# Altium footprint library 13-IC Packages-2smt4e.PcbLib: 49 footprints (part 3 of 4)
Each footprint in its own frame and in the unit in brackets; x right, y up, seen from the top. Pads: shape width x height; smd on the part's side, far side on the other; paste and mask are expansions set on the pad; w line width, h text height; cw(c..) or ccw(c..) is an arc to the next point about the centre after c.
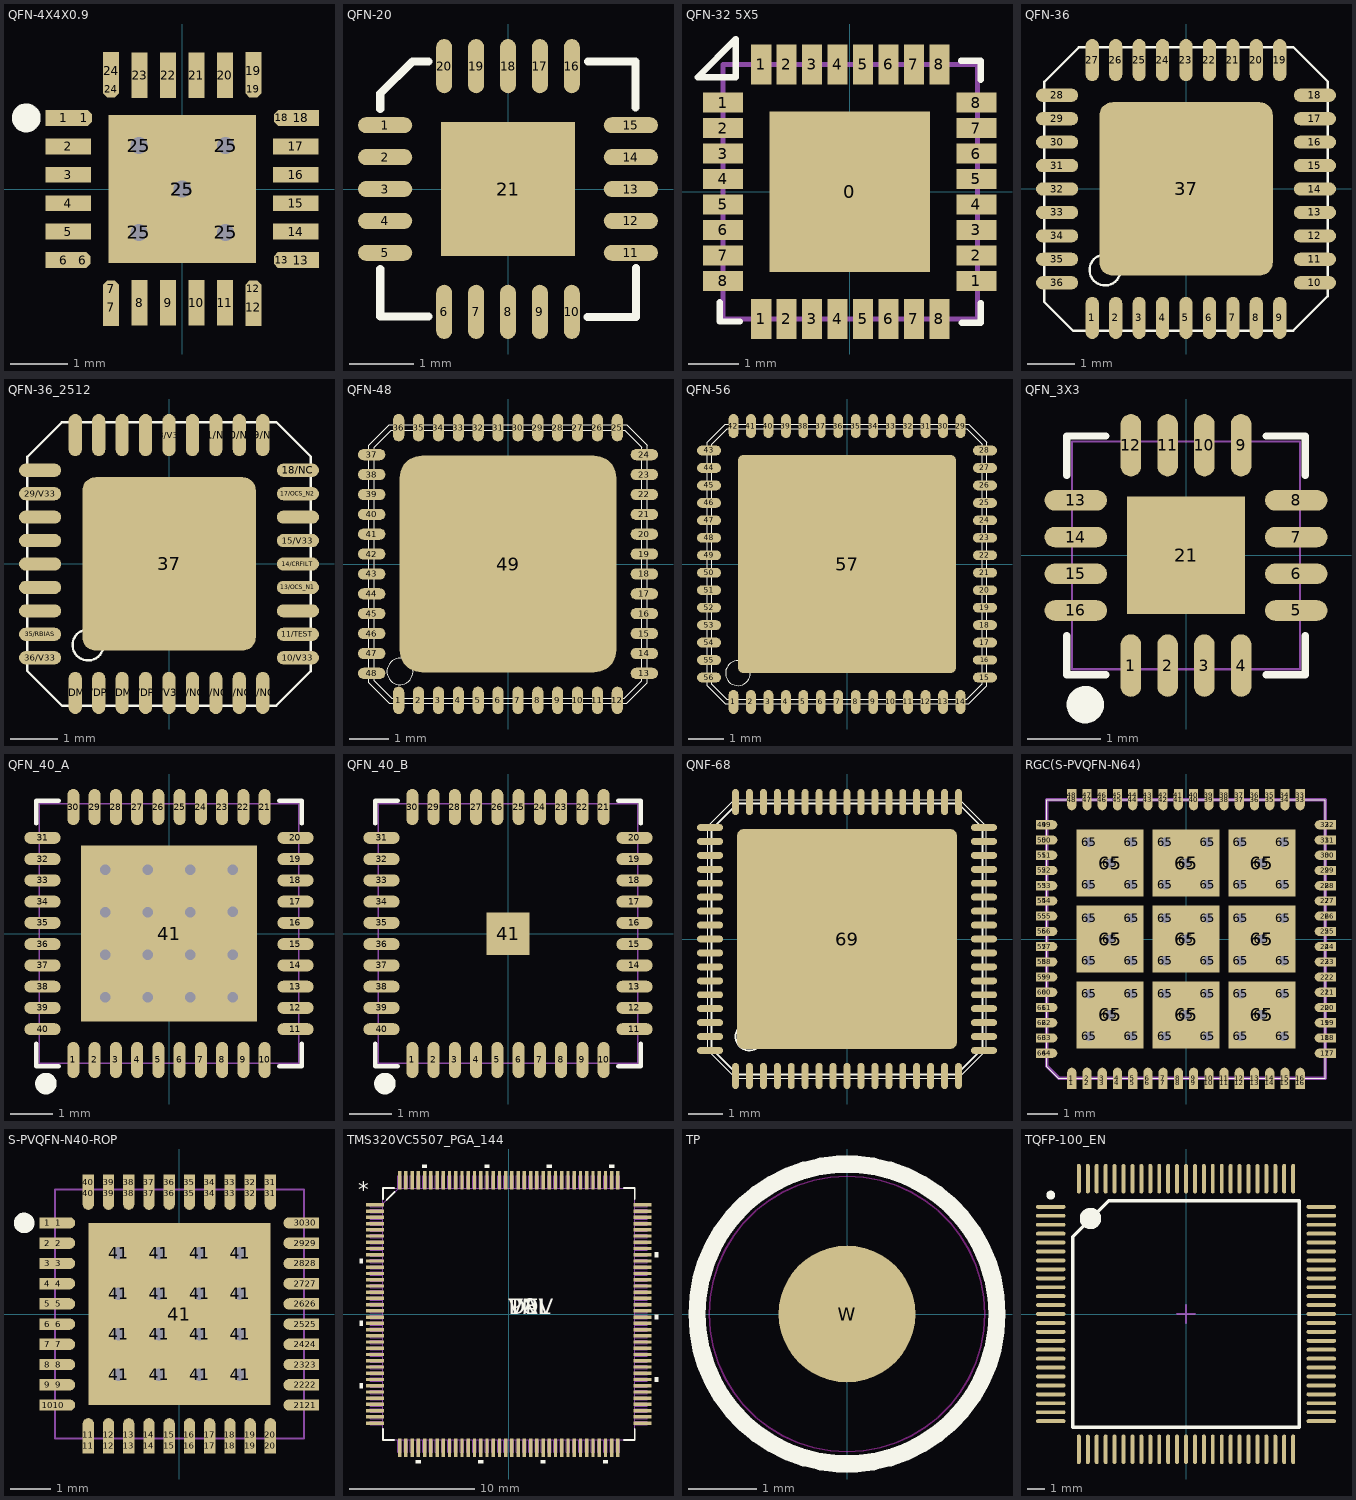
[diagram p2: the footprints below, top view; thin cyan lines are the x and y axes]

## QFN-4X4X0.9 [mm]
pads (38):
  rect 0.65x0.28 smd mask+0.05: 1(-2.08,1.25) 6(-2.08,-1.25) 13(2.08,-1.25) 18(2.08,1.25)
  oct 0.28x0.28 smd mask+0.05: 1(-1.727,1.25) 6(-1.753,-1.25) 7(-1.25,-1.753) 12(1.25,-1.753) 13(1.75,-1.25) 18(1.753,1.25) 19(1.25,1.753) 24(-1.25,1.753)
  rect 0.8x0.28 smd mask+0.05: 2(-2,0.75) 3(-2,0.25) 4(-2,-0.25) 5(-2,-0.75) 14(2,-0.75) 15(2,-0.25) 16(2,0.25) 17(2,0.75)
  rect 0.28x0.65 smd mask+0.05: 7(-1.25,-2.08) 12(1.25,-2.08) 19(1.25,2.08) 24(-1.25,2.08)
  rect 0.28x0.8 smd mask+0.05: 8(-0.75,-2) 9(-0.25,-2) 10(0.25,-2) 11(0.75,-2) 20(0.75,2) 21(0.25,2) 22(-0.25,2) 23(-0.75,2)
  round 0.6 hole 0.3: 25(-0.762,-0.762) 25(-0.762,0.762) 25(0,0) 25(0.762,-0.762) 25(0.762,0.762)
  rect 2.6x2.6 smd mask+0.05: 25(0,0)
Top Overlay:
  circle w0.254: c-2.743,1.25 r0.127
Top Solder:
  region: -2.057,1.651 -2.159,1.651 -2.159,2.159 -1.651,2.159 -1.651,2.057 -2.057,2.057
  region: -1.651,-2.057 -1.651,-2.159 -2.159,-2.159 -2.159,-1.651 -2.057,-1.651 -2.057,-2.057
  region: 2.057,-1.651 2.159,-1.651 2.159,-2.159 1.651,-2.159 1.651,-2.057 2.057,-2.057
  region: 1.651,2.057 1.651,2.159 2.159,2.159 2.159,1.651 2.057,1.651 2.057,2.057
3D body "qfn-4x4.stp": height 0.85, standoff 0, extent -2.01,-2.01 2.01,2.01

## QFN-20 [mm]
pads (21):
  oval 0.85x0.25 smd: 1(-1.925,1) 2(-1.925,0.5) 3(-1.925,0) 4(-1.925,-0.5) 5(-1.925,-1) 11(1.925,-1) 12(1.925,-0.5) 13(1.925,0) 14(1.925,0.5) 15(1.925,1)
  oval 0.25x0.85 smd: 6(-1,-1.925) 7(-0.5,-1.925) 8(0,-1.925) 9(0.5,-1.925) 10(1,-1.925) 16(1,1.925) 17(0.5,1.925) 18(0,1.925) 19(-0.5,1.925) 20(-1,1.925)
  rrect0% 2.1x2.1 smd: 21(0,0)
Top Overlay:
  lines w0.127: -2.001,-1.254 -2.001,-2 -1.245,-2 ; -2.001,1.253 -2.001,1.495 -1.499,1.997 -1.245,1.997 ; 1.243,-2.005 2.003,-2.005 2.003,-1.239 ; 1.252,1.996 1.999,1.996 1.999,1.274
3D body "qfn-4x4.stp": height 0.85, standoff 0, extent -2.01,-2.01 2.01,2.01

## QFN-32 5X5 [mm]
pads (33):
  rect 3.2x3.2 smd mask+0.051: 0(0,0)
  rect 0.8x0.4 smd: 1(-2.527,1.778) 1(2.527,-1.778) 2(-2.527,1.27) 2(2.527,-1.27) 3(-2.527,0.762) 3(2.527,-0.762) 4(-2.527,0.254) 4(2.527,-0.254) 5(-2.527,-0.254) 5(2.527,0.254) 6(-2.527,-0.762) 6(2.527,0.762) 7(-2.527,-1.27) 7(2.527,1.27) 8(-2.527,-1.778) 8(2.527,1.778)
  rect 0.4x0.8 smd: 1(-1.765,-2.54) 1(-1.765,2.54) 2(-1.257,-2.54) 2(-1.257,2.54) 3(-0.749,-2.54) 3(-0.749,2.54) 4(-0.241,-2.54) 4(-0.241,2.54) 5(0.267,-2.54) 5(0.267,2.54) 6(0.775,-2.54) 6(0.775,2.54) 7(1.283,-2.54) 7(1.283,2.54) 8(1.791,-2.54) 8(1.791,2.54)
Top Overlay:
  lines w0.127: -2.591,-2.21 -2.591,-2.591 -2.197,-2.591 ; 2.222,2.616 2.616,2.616 2.616,2.235 ; 2.235,-2.616 2.616,-2.616 2.616,-2.222 ; -3.035,2.286 -2.273,2.286 -2.273,2.921 -2.273,3.048 -3.035,2.286
Mechanical 15:
  lines w0.1: -2.527,-2.54 -2.527,2.54 2.553,2.54 2.553,-2.54 -2.527,-2.54
3D body "qfn32pad.stp": height 0, standoff 0, extent -2.94,1.578 -2.14,1.978
3D body "qfn32pad.stp": height 0, standoff 0, extent -2.94,1.07 -2.14,1.47
3D body "qfn32pad.stp": height 0, standoff 0, extent -2.94,0.562 -2.14,0.962
3D body "qfn32pad.stp": height 0, standoff 0, extent -2.94,0.054 -2.14,0.454
3D body "qfn32pad.stp": height 0, standoff 0, extent -2.94,-0.454 -2.14,-0.054
3D body "qfn32pad.stp": height 0, standoff 0, extent -2.94,-0.962 -2.14,-0.562
3D body "qfn32pad.stp": height 0, standoff 0, extent -2.94,-1.47 -2.14,-1.07
3D body "qfn32pad.stp": height 0, standoff 0, extent -2.94,-1.978 -2.14,-1.578
3D body "qfn32pad.stp": height 0, standoff 0, extent -1.978,-2.94 -1.578,-2.14
3D body "qfn32pad.stp": height 0, standoff 0, extent -1.445,-2.94 -1.045,-2.14
3D body "qfn32pad.stp": height 0, standoff 0, extent -0.937,-2.94 -0.537,-2.14
3D body "qfn32pad.stp": height 0, standoff 0, extent -0.454,-2.94 -0.054,-2.14
3D body "qfn32pad.stp": height 0, standoff 0, extent 0.054,-2.94 0.454,-2.14
3D body "qfn32pad.stp": height 0, standoff 0, extent 0.562,-2.94 0.962,-2.14
3D body "qfn32pad.stp": height 0, standoff 0, extent 1.07,-2.94 1.47,-2.14
3D body "qfn32pad.stp": height 0, standoff 0, extent 1.603,-2.94 2.003,-2.14
3D body "qfn32pad.stp": height 0, standoff 0, extent 2.115,-1.978 2.915,-1.578
3D body "qfn32pad.stp": height 0, standoff 0, extent 2.115,-1.47 2.915,-1.07
3D body "qfn32pad.stp": height 0, standoff 0, extent 2.115,-0.962 2.915,-0.562
3D body "qfn32pad.stp": height 0, standoff 0, extent 2.115,-0.454 2.915,-0.054
3D body "qfn32pad.stp": height 0, standoff 0, extent 2.115,0.054 2.915,0.454
3D body "qfn32pad.stp": height 0, standoff 0, extent 2.115,0.562 2.915,0.962
3D body "qfn32pad.stp": height 0, standoff 0, extent 2.14,1.07 2.94,1.47
3D body "qfn32pad.stp": height 0, standoff 0, extent 2.115,1.578 2.915,1.978
3D body "qfn32pad.stp": height 0, standoff 0, extent 1.578,2.14 1.978,2.94
3D body "qfn32pad.stp": height 0, standoff 0, extent 1.096,2.14 1.496,2.94
3D body "qfn32pad.stp": height 0, standoff 0, extent 0.562,2.14 0.962,2.94
3D body "qfn32pad.stp": height 0, standoff 0, extent 0.054,2.14 0.454,2.94
3D body "qfn32pad.stp": height 0, standoff 0, extent -0.428,2.14 -0.028,2.94
3D body "qfn32pad.stp": height 0, standoff 0, extent -0.936,2.14 -0.536,2.94
3D body "qfn32pad.stp": height 0, standoff 0, extent -1.444,2.14 -1.044,2.94
3D body "qfn32pad.stp": height 0, standoff 0, extent -1.978,2.14 -1.578,2.94
3D body "qfn32-5x5.stp": height 1, standoff 0, extent -2.535,-2.538 2.535,2.538

## QFN-36 [mm]
pads (37):
  oval 0.28x0.9 smd mask+0.051: 1(-2.002,-2.752) 2(-1.502,-2.752) 3(-1.002,-2.752) 4(-0.502,-2.752) 5(-0.002,-2.752) 6(0.498,-2.752) 7(0.998,-2.752) 8(1.498,-2.752) 9(1.998,-2.752) 19(1.998,2.748) 20(1.498,2.748) 21(0.998,2.748) 22(0.498,2.748) 23(-0.002,2.748) 24(-0.502,2.748) 25(-1.002,2.748) 26(-1.502,2.748) 27(-2.002,2.748)
  oval 0.9x0.28 smd mask+0.051: 10(2.748,-2.002) 11(2.748,-1.502) 12(2.748,-1.002) 13(2.748,-0.502) 14(2.748,-0.002) 15(2.748,0.498) 16(2.748,0.998) 17(2.748,1.498) 18(2.748,1.998) 28(-2.752,1.998) 29(-2.752,1.498) 30(-2.752,0.998) 31(-2.752,0.498) 32(-2.752,-0.002) 33(-2.752,-0.502) 34(-2.752,-1.002) 35(-2.752,-1.502) 36(-2.752,-2.002)
  rrect15% 3.7x3.7 smd mask+0.051: 37(0,0)
Top Overlay:
  circle w0.051: c-1.73,-1.73 r0.33
  lines w0.051: -3.025,-2.411 -2.411,-3.025 2.284,-3.025 3.02,-2.288 3.02,2.288 2.288,3.02 -2.288,3.02 -3.025,2.284 -3.025,-2.411
3D body "qfn36.stp": height 0.8, standoff -0.01, extent -2.921,-2.946 2.949,2.924

## QFN-36_2512 [mm]
pads (37):
  oval 0.28x0.9 smd mask+0.051: 1/DM1(-2.002,-2.752) 2/DP1(-1.502,-2.752) 3/DM2(-1.002,-2.752) 4/DP2(-0.502,-2.752) 5/V33(-0.002,-2.752) 6/NC(0.498,-2.752) 7/NC(0.998,-2.752) 8/NC(1.498,-2.752) 9/NC(1.998,-2.752) 19/NC(1.998,2.748) 20/NC(1.498,2.748) 21/NC(0.998,2.748) 22/SDA/SMBDATA/NON_R(0.498,2.748) 23/V33(-0.002,2.748) 24/SCL/SMBCLK/CFG_SE(-0.502,2.748) 25/HS_IND/CFG_SEL1(-1.002,2.748) 26/RESET_N(-1.502,2.748) 27/VBUS_DET(-2.002,2.748)
  oval 0.9x0.28 smd mask+0.051: 10/V33(2.748,-2.002) 11/TEST(2.748,-1.502) 12/PRTPWR1/BC_EN1(2.748,-1.002) 13/OCS_N1(2.748,-0.502) 14/CRFILT(2.748,-0.002) 15/V33(2.748,0.498) 16/PRTPWR2/BC_EN2(2.748,0.998) 17/OCS_N2(2.748,1.498) 18/NC(2.748,1.998) 28/SUSP_IND/LOCAL_PW(-2.752,1.998) 29/V33(-2.752,1.498) 30/USBDM_UP(-2.752,0.998) 31/USBDP_UP(-2.752,0.498) 32/XTALOUT(-2.752,-0.002) 33/XTALIN/CLKIN(-2.752,-0.502) 34/PLLFILT(-2.752,-1.002) 35/RBIAS(-2.752,-1.502) 36/V33(-2.752,-2.002)
  rrect15% 3.7x3.7 smd mask+0.051: 37(0,0)
Top Overlay:
  circle w0.051: c-1.73,-1.73 r0.33
  lines w0.051: -3.025,-2.284 -3.025,2.284 -2.288,3.02 2.288,3.02 3.02,2.288 3.02,-2.288 2.284,-3.025 -2.284,-3.025 -3.025,-2.284
3D body "qfn36.stp": height 0.8, standoff -0.01, extent -2.924,-2.935 2.946,2.935

## QFN-48 [mm] "RFR6275"
pads (49):
  oval 0.28x0.69 smd mask+0.051: 1(-2.75,-3.429) 2(-2.25,-3.429) 3(-1.75,-3.429) 4(-1.25,-3.429) 5(-0.75,-3.429) 6(-0.25,-3.429) 7(0.25,-3.429) 8(0.75,-3.429) 9(1.25,-3.429) 10(1.75,-3.429) 11(2.25,-3.429) 12(2.75,-3.429) 25(2.75,3.429) 26(2.25,3.429) 27(1.75,3.429) 28(1.25,3.429) 29(0.75,3.429) 30(0.25,3.429) 31(-0.25,3.429) 32(-0.75,3.429) 33(-1.25,3.429) 34(-1.75,3.429) 35(-2.25,3.429) 36(-2.75,3.429)
  oval 0.69x0.28 smd mask+0.051: 13(3.429,-2.75) 14(3.429,-2.25) 15(3.429,-1.75) 16(3.429,-1.25) 17(3.429,-0.75) 18(3.429,-0.25) 19(3.429,0.25) 20(3.429,0.75) 21(3.429,1.25) 22(3.429,1.75) 23(3.429,2.25) 24(3.429,2.75) 37(-3.429,2.75) 38(-3.429,2.25) 39(-3.429,1.75) 40(-3.429,1.25) 41(-3.429,0.75) 42(-3.429,0.25) 43(-3.429,-0.25) 44(-3.429,-0.75) 45(-3.429,-1.25) 46(-3.429,-1.75) 47(-3.429,-2.25) 48(-3.429,-2.75)
  rrect20% 5.45x5.45 smd mask+0.051: 49(0,0)
Top Overlay:
  circle w0.025: c-2.718,-2.705 r0.33
  lines w0.005: -3.5,-2.983 -3.5,2.984 -2.984,3.5 2.984,3.5 3.5,2.984 3.5,-2.984 2.984,-3.5 -2.983,-3.5 -3.5,-2.983
  lines w0.025: -3.365,-2.934 -2.921,-3.378 2.921,-3.378 3.365,-2.934 3.365,2.934 2.934,3.365 -2.934,3.365 -3.365,2.934 -3.365,-2.934
3D body "qfn_48.stp": height 0.85, standoff 0, extent -3.505,-3.531 3.525,3.499

## QFN-56 [mm] "RTR6275"
pads (57):
  oval 0.28x0.69 smd mask+0.051: 1(-3.25,-3.95) 2(-2.75,-3.95) 3(-2.25,-3.95) 4(-1.75,-3.95) 5(-1.25,-3.95) 6(-0.75,-3.95) 7(-0.25,-3.95) 8(0.25,-3.95) 9(0.75,-3.95) 10(1.25,-3.95) 11(1.75,-3.95) 12(2.25,-3.95) 13(2.75,-3.95) 14(3.25,-3.95) 29(3.25,3.95) 30(2.75,3.95) 31(2.25,3.95) 32(1.75,3.95) 33(1.25,3.95) 34(0.75,3.95) 35(0.25,3.95) 36(-0.25,3.95) 37(-0.75,3.95) 38(-1.25,3.95) 39(-1.75,3.95) 40(-2.25,3.95) 41(-2.75,3.95) 42(-3.25,3.95)
  oval 0.69x0.28 smd mask+0.051: 15(3.95,-3.25) 17(3.95,-2.25) 18(3.95,-1.75) 19(3.95,-1.25) 20(3.95,-0.75) 21(3.95,-0.25) 22(3.95,0.25) 23(3.95,0.75) 24(3.95,1.25) 25(3.95,1.75) 26(3.95,2.25) 27(3.95,2.75) 28(3.95,3.25) 43(-3.95,3.25) 44(-3.95,2.75) 45(-3.95,2.25) 46(-3.95,1.75) 47(-3.95,1.25) 48(-3.95,0.75) 49(-3.95,0.25) 50(-3.95,-0.25) 51(-3.95,-0.75) 52(-3.95,-1.25) 53(-3.95,-1.75) 54(-3.95,-2.25) 55(-3.95,-2.75) 56(-3.95,-3.25)
  oval 0.69x0.25 smd mask+0.051: 16(3.95,-2.75)
  rrect5% 6.25x6.25 smd mask+0.051: 57(0,0)
Top Overlay:
  circle w0.025: c-3.124,-3.124 r0.356
  lines w0.005: -4,-3.486 -3.486,-4 3.486,-4 4,-3.486 4,3.485 3.485,4 -3.485,4 -4,3.485 -4,-3.486
  lines w0.025: -3.873,-3.442 -3.442,-3.873 3.429,-3.873 3.873,-3.429 3.873,3.429 3.429,3.873 -3.429,3.873 -3.873,3.429 -3.873,-3.442
3D body "qfn_56.stp": height 0.85, standoff 0, extent -4.039,-4.013 3.963,3.988

## QFN_3X3 [mm]
pads (17):
  oval 0.28x0.85 smd mask+0.07: 1(-0.75,-1.5) 2(-0.25,-1.5) 3(0.25,-1.5) 4(0.75,-1.5) 9(0.75,1.5) 10(0.25,1.5) 11(-0.25,1.5) 12(-0.75,1.5)
  oval 0.85x0.28 smd mask+0.07: 5(1.5,-0.75) 6(1.5,-0.25) 7(1.5,0.25) 8(1.5,0.75) 13(-1.5,0.75) 14(-1.5,0.25) 15(-1.5,-0.25) 16(-1.5,-0.75)
  rect 1.6x1.6 smd mask+0.07: 21(0,0)
Top Overlay:
  circle w0.254: c-1.372,-2.032 r0.127
  lines w0.1: -1.626,-1.092 -1.626,-1.626 -1.092,-1.626 ; -1.626,1.092 -1.626,1.626 -1.092,1.626 ; 1.092,-1.626 1.626,-1.626 1.626,-1.092 ; 1.092,1.626 1.626,1.626 1.626,1.092
Mechanical 15:
  lines w0.03: -1.55,-1.55 -1.55,1.55 1.55,1.55 1.55,-1.55 -1.55,-1.55
3D body "qfn3x3.stp": height 1, standoff 0, extent -1.56,-1.56 1.56,1.56
3D body "0_28-0_95.stp": height 0.01, standoff 0, extent -1.975,0.61 -1.025,0.89
3D body "0_28-0_95.stp": height 0.01, standoff 0, extent -1.975,0.11 -1.025,0.39
3D body "0_28-0_95.stp": height 0.01, standoff 0, extent -1.975,-0.39 -1.025,-0.11
3D body "0_28-0_95.stp": height 0.01, standoff 0, extent -1.975,-0.89 -1.025,-0.61
3D body "0_28-0_95.stp": height 0.01, standoff 0, extent -0.89,-1.975 -0.61,-1.025
3D body "0_28-0_95.stp": height 0.01, standoff 0, extent -0.39,-1.975 -0.11,-1.025
3D body "0_28-0_95.stp": height 0.01, standoff 0, extent 0.11,-1.975 0.39,-1.025
3D body "0_28-0_95.stp": height 0.01, standoff 0, extent 0.61,-1.975 0.89,-1.025
3D body "0_28-0_95.stp": height 0.01, standoff 0, extent 1.025,-0.89 1.975,-0.61
3D body "0_28-0_95.stp": height 0.01, standoff 0, extent 1.025,-0.39 1.975,-0.11
3D body "0_28-0_95.stp": height 0.01, standoff 0, extent 1.025,0.11 1.975,0.39
3D body "0_28-0_95.stp": height 0.01, standoff 0, extent 1.025,0.61 1.975,0.89
3D body "0_28-0_95.stp": height 0.01, standoff 0, extent 0.61,1.025 0.89,1.975
3D body "0_28-0_95.stp": height 0.01, standoff 0, extent 0.11,1.025 0.39,1.975
3D body "0_28-0_95.stp": height 0.01, standoff 0, extent -0.39,1.025 -0.11,1.975
3D body "0_28-0_95.stp": height 0.01, standoff 0, extent -0.89,1.025 -0.61,1.975

## QFN_40_A [mm] "QFN_40"
pads (57):
  oval 0.28x0.85 smd mask+0.07: 1(-2.25,-2.975) 2(-1.75,-2.975) 3(-1.25,-2.975) 4(-0.75,-2.975) 5(-0.25,-2.975) 6(0.25,-2.975) 7(0.75,-2.975) 8(1.25,-2.975) 9(1.75,-2.975) 10(2.25,-2.975) 21(2.25,2.975) 22(1.75,2.975) 23(1.25,2.975) 24(0.75,2.975) 25(0.25,2.975) 26(-0.25,2.975) 27(-0.75,2.975) 28(-1.25,2.975) 29(-1.75,2.975) 30(-2.25,2.975)
  oval 0.85x0.28 smd mask+0.07: 11(2.975,-2.25) 12(2.975,-1.75) 13(2.975,-1.25) 14(2.975,-0.75) 15(2.975,-0.25) 16(2.975,0.25) 17(2.975,0.75) 18(2.975,1.25) 19(2.975,1.75) 20(2.975,2.25) 31(-2.975,2.25) 32(-2.975,1.75) 33(-2.975,1.25) 34(-2.975,0.75) 35(-2.975,0.25) 36(-2.975,-0.25) 37(-2.975,-0.75) 38(-2.975,-1.25) 39(-2.975,-1.75) 40(-2.975,-2.25)
  rect 4.15x4.15 smd: 41(0,0)
  round 0.5 hole 0.25 mask+0.07: ""(-1.5,-1.5) ""(-1.5,-0.5) ""(-1.5,0.5) ""(-1.5,1.5) ""(-0.5,-1.5) ""(-0.5,-0.5) ""(-0.5,0.5) ""(-0.5,1.5) ""(0.5,-1.5) ""(0.5,-0.5) ""(0.5,0.5) ""(0.5,1.5) ""(1.5,-1.5) ""(1.5,-0.5) ""(1.5,0.508) ""(1.5,1.5)
Top Overlay:
  circle w0.254: c-2.896,-3.531 r0.127
  lines w0.1: -3.124,-2.591 -3.124,-3.124 -2.591,-3.124 ; -3.124,2.591 -3.124,3.124 -2.591,3.124 ; 2.591,-3.124 3.124,-3.124 3.124,-2.591 ; 2.591,3.124 3.124,3.124 3.124,2.591
Mechanical 15:
  lines w0.03: -3.05,-3.05 -3.05,3.05 3.05,3.05 3.05,-3.05 -3.05,-3.05
3D body "hmc833.stp": height 0.9, standoff 0, extent -3.06,-3.06 3.06,3.06

## QFN_40_B [mm]
pads (41):
  oval 0.28x0.85 smd mask+0.07: 1(-2.25,-2.975) 2(-1.75,-2.975) 3(-1.25,-2.975) 4(-0.75,-2.975) 5(-0.25,-2.975) 6(0.25,-2.975) 7(0.75,-2.975) 8(1.25,-2.975) 9(1.75,-2.975) 10(2.25,-2.975) 21(2.25,2.975) 22(1.75,2.975) 23(1.25,2.975) 24(0.75,2.975) 25(0.25,2.975) 26(-0.25,2.975) 27(-0.75,2.975) 28(-1.25,2.975) 29(-1.75,2.975) 30(-2.25,2.975)
  oval 0.85x0.28 smd mask+0.07: 11(2.975,-2.25) 12(2.975,-1.75) 13(2.975,-1.25) 14(2.975,-0.75) 15(2.975,-0.25) 16(2.975,0.25) 17(2.975,0.75) 18(2.975,1.25) 19(2.975,1.75) 20(2.975,2.25) 31(-2.975,2.25) 32(-2.975,1.75) 33(-2.975,1.25) 34(-2.975,0.75) 35(-2.975,0.25) 36(-2.975,-0.25) 37(-2.975,-0.75) 38(-2.975,-1.25) 39(-2.975,-1.75) 40(-2.975,-2.25)
  rect 1x1 smd: 41(0,0)
Top Overlay:
  circle w0.254: c-2.896,-3.531 r0.127
  lines w0.1: -3.124,-2.591 -3.124,-3.124 -2.591,-3.124 ; -3.124,2.591 -3.124,3.124 -2.591,3.124 ; 2.591,-3.124 3.124,-3.124 3.124,-2.591 ; 2.591,3.124 3.124,3.124 3.124,2.591
Mechanical 15:
  lines w0.03: -3.05,-3.05 3.05,-3.05 3.05,3.05 -3.05,3.05 -3.05,-3.05
3D body "hmc833.stp": height 0.9, standoff 0, extent -3.06,-3.06 3.06,3.06
3D body "0_28-0_95.stp": height 0.01, standoff 0, extent 2.446,-2.4 3.396,-2.121
3D body "0_28-0_95.stp": height 0.01, standoff 0, extent 2.446,-1.892 3.396,-1.613
3D body "0_28-0_95.stp": height 0.01, standoff 0, extent 2.446,-1.384 3.396,-1.105
3D body "0_28-0_95.stp": height 0.01, standoff 0, extent 2.446,-0.876 3.396,-0.597
3D body "0_28-0_95.stp": height 0.01, standoff 0, extent 2.446,-0.368 3.396,-0.089
3D body "0_28-0_95.stp": height 0.01, standoff 0, extent 2.446,0.114 3.396,0.394
3D body "0_28-0_95.stp": height 0.01, standoff 0, extent 2.446,0.622 3.396,0.902
3D body "0_28-0_95.stp": height 0.01, standoff 0, extent 2.446,1.13 3.396,1.41
3D body "0_28-0_95.stp": height 0.01, standoff 0, extent 2.446,1.613 3.396,1.893
3D body "0_28-0_95.stp": height 0.01, standoff 0, extent 2.446,2.121 3.396,2.401
3D body "0_28-0_95.stp": height 0.01, standoff 0, extent -3.396,2.121 -2.446,2.401
3D body "0_28-0_95.stp": height 0.01, standoff 0, extent -3.396,1.613 -2.446,1.893
3D body "0_28-0_95.stp": height 0.01, standoff 0, extent -3.396,1.105 -2.446,1.385
3D body "0_28-0_95.stp": height 0.01, standoff 0, extent -3.396,0.622 -2.446,0.902
3D body "0_28-0_95.stp": height 0.01, standoff 0, extent -3.396,0.114 -2.446,0.394
3D body "0_28-0_95.stp": height 0.01, standoff 0, extent -3.396,-0.394 -2.446,-0.114
3D body "0_28-0_95.stp": height 0.01, standoff 0, extent -3.396,-0.902 -2.446,-0.622
3D body "0_28-0_95.stp": height 0.01, standoff 0, extent -3.396,-1.384 -2.446,-1.105
3D body "0_28-0_95.stp": height 0.01, standoff 0, extent -3.396,-1.892 -2.446,-1.613
3D body "0_28-0_95.stp": height 0.01, standoff 0, extent -3.396,-2.375 -2.446,-2.095
3D body "0_28-0_95.stp": height 0.01, standoff 0, extent -2.375,-3.396 -2.095,-2.446
3D body "0_28-0_95.stp": height 0.01, standoff 0, extent -1.893,-3.396 -1.613,-2.446
3D body "0_28-0_95.stp": height 0.01, standoff 0, extent -1.385,-3.396 -1.105,-2.446
3D body "0_28-0_95.stp": height 0.01, standoff 0, extent -0.902,-3.396 -0.622,-2.446
3D body "0_28-0_95.stp": height 0.01, standoff 0, extent -0.394,-3.396 -0.114,-2.446
3D body "0_28-0_95.stp": height 0.01, standoff 0, extent 0.114,-3.396 0.394,-2.446
3D body "0_28-0_95.stp": height 0.01, standoff 0, extent 0.622,-3.396 0.902,-2.446
3D body "0_28-0_95.stp": height 0.01, standoff 0, extent 1.105,-3.396 1.384,-2.446
3D body "0_28-0_95.stp": height 0.01, standoff 0, extent 1.613,-3.396 1.892,-2.446
3D body "0_28-0_95.stp": height 0.01, standoff 0, extent 2.095,-3.396 2.375,-2.446
3D body "0_28-0_95.stp": height 0.01, standoff 0, extent 2.121,2.446 2.401,3.396
3D body "0_28-0_95.stp": height 0.01, standoff 0, extent 1.613,2.446 1.893,3.396
3D body "0_28-0_95.stp": height 0.01, standoff 0, extent 1.105,2.446 1.385,3.396
3D body "0_28-0_95.stp": height 0.01, standoff 0, extent 0.622,2.446 0.902,3.396
3D body "0_28-0_95.stp": height 0.01, standoff 0, extent 0.114,2.446 0.394,3.396
3D body "0_28-0_95.stp": height 0.01, standoff 0, extent -0.394,2.446 -0.114,3.396
3D body "0_28-0_95.stp": height 0.01, standoff 0, extent -0.876,2.471 -0.597,3.421
3D body "0_28-0_95.stp": height 0.01, standoff 0, extent -1.41,2.446 -1.13,3.396
3D body "0_28-0_95.stp": height 0.01, standoff 0, extent -1.892,2.446 -1.613,3.396
3D body "0_28-0_95.stp": height 0.01, standoff 0, extent -2.375,2.446 -2.095,3.396

## QNF-68 [mm] "RTR6280 / RTR6285"
pads (69):
  oval 0.2x0.75 smd paste+0 mask+0.051: 1(-3.2,-3.93) 2(-2.8,-3.93) 3(-2.4,-3.93) 4(-2,-3.93) 5(-1.6,-3.93) 6(-1.2,-3.93) 7(-0.8,-3.93) 8(-0.4,-3.93) 9(0,-3.93) 10(0.4,-3.93) 11(0.8,-3.93) 12(1.2,-3.93) 13(1.6,-3.93) 14(2,-3.93) 15(2.4,-3.93) 16(2.8,-3.93) 17(3.2,-3.93) 35(3.2,3.93) 36(2.8,3.93) 37(2.4,3.93) 38(2,3.93) 39(1.6,3.93) 40(1.2,3.93) 41(0.8,3.93) 42/GPS_IN(0.4,3.93) 43(0,3.93) 44(-0.4,3.93) 45(-0.8,3.93) 46(-1.2,3.93) 47(-1.6,3.93) 48(-2,3.93) 49(-2.4,3.93) 50(-2.8,3.93) 51(-3.2,3.93)
  oval 0.75x0.2 smd paste+0 mask+0.051: 18(3.93,-3.2) 19/NC(3.93,-2.8) 20(3.93,-2.4) 21(3.93,-2) 22(3.93,-1.6) 23(3.93,-1.2) 24(3.93,-0.8) 25(3.93,-0.4) 26(3.93,0) 27(3.93,0.4) 28(3.93,0.8) 29(3.93,1.2) 30(3.93,1.6) 31(3.93,2) 32(3.93,2.4) 33(3.93,2.8) 34(3.93,3.2) 52(-3.93,3.2) 53(-3.93,2.8) 54(-3.93,2.4) 55(-3.93,2) 56(-3.93,1.6) 57(-3.93,1.2) 58(-3.93,0.8) 59(-3.93,0.4) 60(-3.93,0) 61(-3.93,-0.4) 62(-3.93,-0.8) 63(-3.93,-1.2) 64(-3.93,-1.6) 65(-3.93,-2) 66(-3.93,-2.4) 67(-3.93,-2.8) 68(-3.93,-3.2)
  rrect5% 6.3x6.3 smd mask+0.051: 69(0,0)
Top Overlay:
  circle w0.051: c-2.8,-2.8 r0.4
  lines w0.013: -4,-3.2 -4,3.239 -3.239,4 3.239,4 4,3.239 4,-3.2 3.2,-4 -3.2,-4 -4,-3.2
  lines w0.051: -3.886,-3.15 -3.886,3.15 -3.15,3.886 3.2,3.886 3.886,3.2 3.886,-3.15 3.15,-3.886 -3.15,-3.886 -3.886,-3.15
3D body "qfn_68.stp": height 0.85, standoff 0, extent -4.017,-4.015 4.013,4.015

## RGC(S-PVQFN-N64) [mm]
pads (182):
  rect 0.3x0.4 smd mask+0.07: 1(-3.75,-4.724) 2(-3.25,-4.724) 3(-2.75,-4.724) 4(-2.25,-4.724) 5(-1.75,-4.724) 6(-1.25,-4.724) 7(-0.75,-4.724) 8(-0.25,-4.724) 9(0.25,-4.724) 10(0.75,-4.724) 11(1.25,-4.724) 12(1.75,-4.724) 13(2.25,-4.724) 14(2.75,-4.724) 15(3.25,-4.724) 16(3.75,-4.724) 33(3.75,4.724) 34(3.25,4.724) 35(2.75,4.724) 36(2.25,4.724) 37(1.75,4.724) 38(1.25,4.724) 39(0.75,4.724) 40(0.25,4.724) 41(-0.25,4.724) 42(-0.75,4.724) 43(-1.25,4.724) 44(-1.75,4.724) 45(-2.25,4.724) 46(-2.75,4.724) 47(-3.25,4.724) 48(-3.75,4.724)
  oval 0.3x0.7 smd mask+0.07: 1(-3.75,-4.575) 2(-3.25,-4.575) 3(-2.75,-4.575) 4(-2.25,-4.575) 5(-1.75,-4.575) 6(-1.25,-4.575) 7(-0.75,-4.575) 8(-0.25,-4.575) 9(0.25,-4.575) 10(0.75,-4.575) 11(1.25,-4.575) 12(1.75,-4.575) 13(2.25,-4.575) 14(2.75,-4.575) 15(3.25,-4.575) 16(3.75,-4.575) 33(3.75,4.575) 34(3.25,4.575) 35(2.75,4.575) 36(2.25,4.575) 37(1.75,4.575) 38(1.25,4.575) 39(0.75,4.575) 40(0.25,4.575) 41(-0.254,4.575) 42(-0.75,4.575) 43(-1.25,4.575) 44(-1.75,4.575) 45(-2.25,4.575) 46(-2.75,4.575) 47(-3.25,4.575) 48(-3.75,4.575)
  oval 0.7x0.3 smd mask+0.07: 17(4.575,-3.75) 18(4.575,-3.25) 19(4.575,-2.75) 20(4.575,-2.25) 21(4.575,-1.75) 22(4.575,-1.25) 23(4.575,-0.75) 24(4.575,-0.25) 25(4.575,0.25) 26(4.575,0.75) 27(4.575,1.25) 28(4.575,1.75) 29(4.575,2.25) 30(4.575,2.75) 31(4.575,3.25) 32(4.575,3.75) 49(-4.575,3.75) 50(-4.575,3.25) 51(-4.575,2.75) 52(-4.575,2.25) 53(-4.575,1.75) 54(-4.575,1.25) 55(-4.575,0.75) 56(-4.575,0.25) 57(-4.575,-0.25) 58(-4.575,-0.75) 59(-4.575,-1.25) 60(-4.575,-1.75) 61(-4.575,-2.25) 62(-4.575,-2.75) 63(-4.575,-3.25) 64(-4.575,-3.75)
  rect 0.4x0.3 smd mask+0.07: 17(4.724,-3.75) 18(4.724,-3.25) 19(4.724,-2.75) 20(4.724,-2.25) 21(4.724,-1.75) 22(4.724,-1.25) 23(4.724,-0.75) 24(4.724,-0.25) 25(4.724,0.25) 26(4.724,0.75) 27(4.724,1.25) 28(4.724,1.75) 29(4.724,2.25) 30(4.724,2.75) 31(4.724,3.25) 32(4.724,3.75) 49(-4.724,3.75) 50(-4.724,3.25) 51(-4.724,2.75) 52(-4.724,2.25) 53(-4.724,1.75) 54(-4.724,1.25) 55(-4.724,0.75) 56(-4.724,0.25) 57(-4.724,-0.25) 58(-4.724,-0.75) 59(-4.724,-1.25) 60(-4.724,-1.75) 61(-4.724,-2.25) 62(-4.724,-2.75) 63(-4.724,-3.25) 64(-4.724,-3.75)
  round 0.61 hole 0.305: 65(-3.175,-3.2) 65(-3.175,-1.803) 65(-3.175,1.778) 65(-3.175,3.175) 65(-3.175,-0.711) 65(-3.175,0.686) 65(-2.489,2.489) 65(-1.778,-3.2) 65(-1.778,-1.803) 65(-1.778,1.778) 65(-1.778,3.175) 65(-1.778,-0.711) 65(-1.778,0.686) 65(-0.686,-3.2) 65(-0.686,-1.803) 65(-0.686,-0.711) 65(-0.686,0.686) 65(-0.686,1.778) 65(-0.686,3.175) 65(0.711,-3.2) 65(0.711,-1.803) 65(0.711,-0.711) 65(0.711,0.686) 65(0.711,1.778) 65(0.711,3.175) 65(1.803,-3.2) 65(1.803,-1.803) 65(1.803,1.778) 65(1.803,3.175) 65(1.803,-0.711) 65(1.803,0.686) 65(3.2,-3.2) 65(3.2,-1.803) 65(3.2,1.778) 65(3.2,3.175) 65(3.2,-0.711) 65(3.2,0.686)
  rect 2.2x2.2 smd mask+0.07: 65(-2.489,-2.489) 65(-2.489,0) 65(-2.489,2.489) 65(0,-2.489) 65(0,0) 65(0,2.489) 65(2.489,-2.489) 65(2.489,0) 65(2.489,2.489)
  round 0.6 hole 0.3: 65(-2.489,-2.489) 65(-2.489,0) 65(0,-2.489) 65(0,0) 65(0,2.489) 65(2.489,-2.489) 65(2.489,0) 65(2.489,2.489)
Top Overlay:
  lines w0.02: -4.572,-4.191 -4.572,4.572 4.572,4.572 4.572,-4.572 -4.191,-4.572 -4.572,-4.191
Top Solder:
  region: 4.623,4.089 4.623,4.623 4.089,4.623 4.089,4.826 4.826,4.826 4.826,4.089
  region: -4.089,4.623 -4.623,4.623 -4.623,4.089 -4.826,4.089 -4.826,4.826 -4.089,4.826
  region: -4.623,-4.089 -4.623,-4.623 -4.089,-4.623 -4.089,-4.826 -4.826,-4.826 -4.826,-4.089
  region: 4.089,-4.623 4.623,-4.623 4.623,-4.089 4.826,-4.089 4.826,-4.826 4.089,-4.826
Mechanical 11:
  lines w0.127: -4.572,-4.166 -4.572,4.572 4.572,4.572 4.572,-4.572 -4.166,-4.572 -4.572,-4.166
3D body "rgc_s-pvqfn-n64.stp": height 1, standoff 0, extent -4.58,-4.58 4.58,4.58

## S-PVQFN-N40-ROP [mm]
pads (97):
  rect 0.4x0.28 smd mask+0.07: 1(-3.251,2.25) 2(-3.251,1.75) 3(-3.251,1.25) 4(-3.251,0.75) 5(-3.251,0.25) 6(-3.251,-0.25) 7(-3.251,-0.75) 8(-3.251,-1.25) 9(-3.251,-1.75) 10(-3.251,-2.25) 21(3.251,-2.25) 22(3.251,-1.75) 23(3.251,-1.25) 24(3.251,-0.75) 25(3.251,-0.25) 26(3.251,0.25) 27(3.251,0.75) 28(3.251,1.25) 29(3.251,1.75) 30(3.251,2.25)
  oval 0.813x0.28 smd mask+0.07: 1(-2.98,2.25) 2(-2.98,1.75) 3(-2.98,1.25) 4(-2.98,0.75) 5(-2.98,0.25) 6(-2.98,-0.25) 7(-2.98,-0.75) 8(-2.98,-1.25) 9(-2.98,-1.75) 10(-2.98,-2.25) 21(2.98,-2.25) 22(2.98,-1.75) 23(2.98,-1.25) 24(2.98,-0.75) 25(2.98,-0.25) 26(2.98,0.25) 27(2.98,0.75) 28(2.98,1.25) 29(2.98,1.75) 30(2.98,2.25)
  rect 0.28x0.4 smd mask+0.07: 11(-2.25,-3.251) 12(-1.75,-3.251) 13(-1.25,-3.251) 14(-0.75,-3.251) 15(-0.25,-3.251) 16(0.25,-3.251) 17(0.75,-3.251) 18(1.25,-3.251) 19(1.75,-3.251) 20(2.25,-3.251) 31(2.25,3.251) 32(1.75,3.251) 33(1.25,3.251) 34(0.75,3.251) 35(0.25,3.251) 36(-0.25,3.251) 37(-0.75,3.251) 38(-1.25,3.251) 39(-1.75,3.251) 40(-2.25,3.251)
  oval 0.28x0.813 smd mask+0.07: 11(-2.25,-2.98) 12(-1.75,-2.98) 13(-1.25,-2.98) 14(-0.75,-2.98) 15(-0.25,-2.98) 16(0.25,-2.98) 17(0.75,-2.98) 18(1.25,-2.98) 19(1.75,-2.98) 20(2.25,-2.98) 31(2.25,2.98) 32(1.75,2.98) 33(1.25,2.98) 34(0.75,2.98) 35(0.25,2.98) 36(-0.25,2.98) 37(-0.75,2.98) 38(-1.25,2.98) 39(-1.75,2.98) 40(-2.25,2.98)
  round 0.625 hole 0.3: 41(-1.5,-1.5) 41(-1.5,-0.5) 41(-1.5,0.5) 41(-1.5,1.5) 41(-0.5,-1.5) 41(-0.5,-0.5) 41(-0.5,0.5) 41(-0.5,1.5) 41(0.5,-1.5) 41(0.5,-0.5) 41(0.5,0.5) 41(0.5,1.5) 41(1.5,-1.5) 41(1.5,-0.5) 41(1.5,0.5) 41(1.5,1.5)
  rect 4.5x4.5 smd mask+0.07: 41(0,0)
Top Overlay:
  circle w0.254: c-3.835,2.25 r0.127
Top Solder:
  region: -3.124,2.591 -3.124,3.124 -2.591,3.124 -2.591,3.327 -3.327,3.327 -3.327,2.591
  region: -2.591,-3.124 -3.124,-3.124 -3.124,-2.591 -3.327,-2.591 -3.327,-3.327 -2.591,-3.327
  region: 3.124,-2.591 3.124,-3.124 2.591,-3.124 2.591,-3.327 3.327,-3.327 3.327,-2.591
  region: 2.591,3.124 3.124,3.124 3.124,2.591 3.327,2.591 3.327,3.327 2.591,3.327
Mechanical 15:
  lines w0.05: -3.075,-3.075 3.075,-3.075 3.075,3.075 -3.075,3.075 -3.075,-3.075
3D body "s-pvqfn-n40.stp": height 1.01, standoff 0, extent -3.08,-3.08 3.08,3.08
3D body "0_85-0_28.stp": height 0.01, standoff 0, extent 2.605,2.11 3.455,2.39
3D body "0_85-0_28.stp": height 0.01, standoff 0, extent 2.602,1.61 3.453,1.89
3D body "0_85-0_28.stp": height 0.01, standoff 0, extent 2.602,1.112 3.453,1.392
3D body "0_85-0_28.stp": height 0.01, standoff 0, extent 2.602,0.61 3.453,0.89
3D body "0_85-0_28.stp": height 0.01, standoff 0, extent 2.602,0.11 3.453,0.39
3D body "0_85-0_28.stp": height 0.01, standoff 0, extent 2.602,-0.387 3.453,-0.108
3D body "0_85-0_28.stp": height 0.01, standoff 0, extent 2.602,-0.887 3.453,-0.607
3D body "0_85-0_28.stp": height 0.01, standoff 0, extent 2.6,-1.39 3.45,-1.11
3D body "0_85-0_28.stp": height 0.01, standoff 0, extent 2.602,-1.89 3.453,-1.61
3D body "0_85-0_28.stp": height 0.01, standoff 0, extent 2.6,-2.392 3.45,-2.113
3D body "0_85-0_28.stp": height 0.01, standoff 0, extent 2.113,2.6 2.392,3.45
3D body "0_85-0_28.stp": height 0.01, standoff 0, extent 1.61,2.602 1.89,3.453
3D body "0_85-0_28.stp": height 0.01, standoff 0, extent 1.105,2.602 1.385,3.453
3D body "0_85-0_28.stp": height 0.01, standoff 0, extent 0.605,2.602 0.885,3.453
3D body "0_85-0_28.stp": height 0.01, standoff 0, extent 0.11,2.6 0.39,3.45
3D body "0_85-0_28.stp": height 0.01, standoff 0, extent -0.392,2.597 -0.112,3.447
3D body "0_85-0_28.stp": height 0.01, standoff 0, extent -0.893,2.597 -0.613,3.447
3D body "0_85-0_28.stp": height 0.01, standoff 0, extent -1.39,2.597 -1.11,3.447
3D body "0_85-0_28.stp": height 0.01, standoff 0, extent -1.89,2.6 -1.61,3.45
3D body "0_85-0_28.stp": height 0.01, standoff 0, extent -2.387,2.602 -2.107,3.453
3D body "0_85-0_28.stp": height 0.01, standoff 0, extent -3.455,2.11 -2.605,2.39
3D body "0_85-0_28.stp": height 0.01, standoff 0, extent -3.453,1.613 -2.602,1.893
3D body "0_85-0_28.stp": height 0.01, standoff 0, extent -3.453,1.112 -2.602,1.392
3D body "0_85-0_28.stp": height 0.01, standoff 0, extent -3.453,0.61 -2.602,0.89
3D body "0_85-0_28.stp": height 0.01, standoff 0, extent -3.453,0.11 -2.602,0.39
3D body "0_85-0_28.stp": height 0.01, standoff 0, extent -3.455,-0.39 -2.605,-0.11
3D body "0_85-0_28.stp": height 0.01, standoff 0, extent -3.457,-0.893 -2.607,-0.613
3D body "0_85-0_28.stp": height 0.01, standoff 0, extent -3.455,-1.392 -2.605,-1.112
3D body "0_85-0_28.stp": height 0.01, standoff 0, extent -3.455,-1.885 -2.605,-1.605
3D body "0_85-0_28.stp": height 0.01, standoff 0, extent -3.455,-2.39 -2.605,-2.11
3D body "0_85-0_28.stp": height 0.01, standoff 0, extent -2.395,-3.45 -2.115,-2.6
3D body "0_85-0_28.stp": height 0.01, standoff 0, extent -1.89,-3.455 -1.61,-2.605
3D body "0_85-0_28.stp": height 0.01, standoff 0, extent -1.39,-3.45 -1.11,-2.6
3D body "0_85-0_28.stp": height 0.01, standoff 0, extent -0.897,-3.455 -0.617,-2.605
3D body "0_85-0_28.stp": height 0.01, standoff 0, extent -0.393,-3.453 -0.113,-2.602
3D body "0_85-0_28.stp": height 0.01, standoff 0, extent 0.105,-3.45 0.385,-2.6
3D body "0_85-0_28.stp": height 0.01, standoff 0, extent 0.605,-3.453 0.885,-2.602
3D body "0_85-0_28.stp": height 0.01, standoff 0, extent 1.112,-3.453 1.392,-2.602
3D body "0_85-0_28.stp": height 0.01, standoff 0, extent 1.61,-3.447 1.89,-2.597
3D body "0_85-0_28.stp": height 0.01, standoff 0, extent 2.113,-3.453 2.392,-2.602

## TMS320VC5507_PGA_144 [mm]
pads (144):
  rect 1.461x0.27 smd mask+0.07: 1(-10.725,8.75) 2(-10.725,8.25) 3(-10.725,7.75) 4(-10.725,7.25) 5(-10.725,6.75) 6(-10.725,6.25) 7(-10.725,5.75) 8(-10.725,5.25) 9(-10.725,4.75) 10(-10.725,4.25) 11(-10.725,3.75) 12(-10.725,3.25) 13(-10.725,2.75) 14(-10.725,2.25) 15(-10.725,1.75) 16(-10.725,1.25) 17(-10.725,0.75) 18(-10.725,0.25) 19(-10.725,-0.25) 20(-10.725,-0.75) 21(-10.725,-1.25) 22(-10.725,-1.75) 23(-10.725,-2.25) 24(-10.725,-2.75) 25(-10.725,-3.25) 26(-10.725,-3.75) 27(-10.725,-4.25) 28(-10.725,-4.75) 29(-10.725,-5.25) 30(-10.725,-5.75) 31(-10.725,-6.25) 32(-10.725,-6.75) 33(-10.725,-7.25) 34(-10.725,-7.75) 35(-10.725,-8.25) 36(-10.725,-8.75) 73(10.725,-8.75) 74(10.725,-8.25) 75(10.725,-7.75) 76(10.725,-7.25) 77(10.725,-6.75) 78(10.725,-6.25) 79(10.725,-5.75) 80(10.725,-5.25) 81(10.725,-4.75) 82(10.725,-4.25) 83(10.725,-3.75) 84(10.725,-3.25) 85(10.725,-2.75) 86(10.725,-2.25) 87(10.725,-1.75) 88(10.725,-1.25) 89(10.725,-0.75) 90(10.725,-0.25) 91(10.725,0.25) 92(10.725,0.75) 93(10.725,1.25) 94(10.725,1.75) 95(10.725,2.25) 96(10.725,2.75) 97(10.725,3.25) 98(10.725,3.75) 99(10.725,4.25) 100(10.725,4.75) 101(10.725,5.25) 102(10.725,5.75) 103(10.725,6.25) 104(10.725,6.75) 105(10.725,7.25) 106(10.725,7.75) 107(10.725,8.25) 108(10.725,8.75)
  rect 0.27x1.461 smd mask+0.07: 37(-8.75,-10.725) 38(-8.25,-10.725) 39(-7.75,-10.725) 40(-7.25,-10.725) 41(-6.75,-10.725) 42(-6.25,-10.725) 43(-5.75,-10.725) 44(-5.25,-10.725) 45(-4.75,-10.725) 46(-4.25,-10.725) 47(-3.75,-10.725) 48(-3.25,-10.725) 49(-2.75,-10.725) 50(-2.25,-10.725) 51(-1.75,-10.725) 52(-1.25,-10.725) 53(-0.75,-10.725) 54(-0.25,-10.725) 55(0.25,-10.725) 56(0.75,-10.725) 57(1.25,-10.725) 58(1.75,-10.725) 59(2.25,-10.725) 60(2.75,-10.725) 61(3.25,-10.725) 62(3.75,-10.725) 63(4.25,-10.725) 64(4.75,-10.725) 65(5.25,-10.725) 66(5.75,-10.725) 67(6.25,-10.725) 68(6.75,-10.725) 69(7.25,-10.725) 70(7.75,-10.725) 71(8.25,-10.725) 72(8.75,-10.725) 109(8.75,10.725) 110(8.25,10.725) 111(7.75,10.725) 112(7.25,10.725) 113(6.75,10.725) 114(6.25,10.725) 115(5.75,10.725) 116(5.25,10.725) 117(4.75,10.725) 118(4.25,10.725) 119(3.75,10.725) 120(3.25,10.725) 121(2.75,10.725) 122(2.25,10.725) 123(1.75,10.725) 124(1.25,10.725) 125(0.75,10.725) 126(0.25,10.725) 127(-0.25,10.725) 128(-0.75,10.725) 129(-1.25,10.725) 130(-1.75,10.725) 131(-2.25,10.725) 132(-2.75,10.725) 133(-3.25,10.725) 134(-3.75,10.725) 135(-4.25,10.725) 136(-4.75,10.725) 137(-5.25,10.725) 138(-5.75,10.725) 139(-6.25,10.725) 140(-6.75,10.725) 141(-7.25,10.725) 142(-7.75,10.725) 143(-8.25,10.725)
  rect 0.27x1.461 smd: 144(-8.75,10.725)
Top Overlay:
  region: -6.559,11.71 -6.94,11.71 -6.94,11.964 -6.559,11.964
  region: -1.559,11.71 -1.94,11.71 -1.94,11.964 -1.559,11.964
  region: 3.441,11.71 3.06,11.71 3.06,11.964 3.441,11.964
  region: 8.441,11.71 8.06,11.71 8.06,11.964 8.441,11.964
  region: 11.71,4.941 11.964,4.941 11.964,4.56 11.71,4.56
  region: 11.71,-0.059 11.964,-0.059 11.964,-0.44 11.71,-0.44
  region: 11.71,-5.059 11.964,-5.059 11.964,-5.44 11.71,-5.44
  region: 7.94,-11.71 7.559,-11.71 7.559,-11.964 7.94,-11.964
  region: 2.94,-11.71 2.559,-11.71 2.559,-11.964 2.94,-11.964
  region: -2.06,-11.71 -2.441,-11.71 -2.441,-11.964 -2.06,-11.964
  region: -7.06,-11.71 -7.441,-11.71 -7.441,-11.964 -7.06,-11.964
  region: -11.71,-5.559 -11.964,-5.559 -11.964,-5.94 -11.71,-5.94
  region: -11.71,-0.559 -11.964,-0.559 -11.964,-0.94 -11.71,-0.94
  region: -11.71,4.441 -11.964,4.441 -11.964,4.06 -11.71,4.06
  lines w0.152: -10.1,-9.218 -10.1,-10.1 -9.218,-10.1 ; -10.1,9.218 -10.1,10.1 -9.218,10.1 ; -9.786,9.144 -9.144,9.786 ; 9.218,-10.1 10.1,-10.1 10.1,-9.218 ; 9.218,10.1 10.1,10.1 10.1,9.218
  text "TOL" at 0,0 h1.27
  text "VAL" at 0,0 h1.27
  text "DEV" at 0,0 h1.27
  text "PN" at 0,0 h1.27
  text "*" at -12.091,9.381 h1.27
Mechanical 1:
  drawing of 581 lines, arcs and shapes, not listed
  text "*" at -12.091,9.381 h1.27
3D body "tms320vc5507_pga_144.stp": height 1.61, standoff 0, extent -11.151,-11.072 11.049,11.122

## TP [mm]
height 11.7
pads (1):
  round 2 smd mask+1: W(0,0)
Top Overlay:
  circle w0.254: c0,0 r2.195
Keep-Out Layer:
  circle w0.025: c0,0 r2.017
3D body "1_016-1_016-3_tp.stp": height 0.02, standoff 0, extent -1.5,-1.5 1.5,1.5

## TQFP-100_EN [mm]
pads (100):
  oval 1.65x0.22 smd: 1(-7.575,6)
  oval 1.65x0.22 smd mask+0.07: 2(-7.575,5.5) 3(-7.575,5) 4(-7.575,4.5) 5(-7.575,4) 6(-7.575,3.5) 7(-7.575,3) 8(-7.575,2.5) 9(-7.575,2) 10(-7.575,1.5) 11(-7.575,1) 12(-7.575,0.5) 13(-7.575,0) 14(-7.575,-0.5) 15(-7.575,-1) 16(-7.575,-1.5) 17(-7.575,-2) 18(-7.575,-2.5) 19(-7.575,-3) 20(-7.575,-3.5) 21(-7.575,-4) 22(-7.575,-4.5) 23(-7.575,-5) 24(-7.575,-5.5) 25(-7.575,-6) 51(7.575,-6) 52(7.575,-5.5) 53(7.575,-5) 54(7.575,-4.5) 55(7.575,-4) 56(7.575,-3.5) 57(7.575,-3) 58(7.575,-2.5) 59(7.575,-2) 60(7.575,-1.5) 61(7.575,-1) 62(7.575,-0.5) 63(7.575,0) 64(7.575,0.5) 65(7.575,1) 66(7.575,1.5) 67(7.575,2) 68(7.575,2.5) 69(7.575,3) 70(7.575,3.5) 71(7.575,4) 72(7.575,4.5) 73(7.575,5) 74(7.575,5.5) 75(7.575,6)
  oval 0.22x1.65 smd mask+0.07: 26(-6,-7.575) 27(-5.5,-7.575) 28(-5,-7.575) 29(-4.5,-7.575) 30(-4,-7.575) 31(-3.5,-7.575) 32(-3,-7.575) 33(-2.5,-7.575) 34(-2,-7.575) 35(-1.5,-7.575) 36(-1,-7.575) 37(-0.5,-7.575) 38(0,-7.575) 39(0.5,-7.575) 40(1,-7.575) 41(1.5,-7.575) 42(2,-7.575) 43(2.5,-7.575) 44(3,-7.575) 45(3.5,-7.575) 46(4,-7.575) 47(4.5,-7.575) 48(5,-7.575) 49(5.5,-7.575) 50(6,-7.575) 76(6,7.575) 77(5.5,7.575) 78(5,7.575) 79(4.5,7.575) 80(4,7.575) 81(3.5,7.575) 82(3,7.575) 83(2.5,7.575) 84(2,7.575) 85(1.5,7.575) 86(1,7.575) 87(0.5,7.575) 88(0,7.575) 89(-0.5,7.575) 90(-1,7.575) 91(-1.5,7.575) 92(-2,7.575) 93(-2.5,7.575) 94(-3,7.575) 95(-3.5,7.575) 96(-4,7.575) 97(-4.5,7.575) 98(-5,7.575) 99(-5.5,7.575) 100(-6,7.575)
Top Overlay:
  circle w0.6: c-5.35,5.35 r0.3
  circle w0.25: c-7.575,6.66 r0.125
  lines w0.2: -6.35,-6.35 6.35,-6.35 6.35,6.35 -4.318,6.35 -6.35,4.318 -6.35,-6.35
Mechanical 15:
  lines w0.1: -0.5,0 0.5,0 ; 0,-0.5 0,0.5
3D body "lc4128v.stp": height 1.6, standoff 0.03, extent -7.9,-7.9 7.9,7.9
3D body "022-1_65.stp": height 0.02, standoff 0, extent 6.744,5.897 8.394,6.117
3D body "022-1_65.stp": height 0.02, standoff 0, extent 6.744,5.397 8.394,5.617
3D body "022-1_65.stp": height 0.02, standoff 0, extent 6.744,5.397 8.394,5.617
3D body "022-1_65.stp": height 0.02, standoff 0, extent 6.744,4.897 8.394,5.117
3D body "022-1_65.stp": height 0.02, standoff 0, extent 6.744,4.397 8.394,4.617
3D body "022-1_65.stp": height 0.02, standoff 0, extent -8.406,5.897 -6.756,6.117
3D body "022-1_65.stp": height 0.02, standoff 0, extent -8.406,5.397 -6.756,5.617
3D body "022-1_65.stp": height 0.02, standoff 0, extent -8.406,4.897 -6.756,5.117
3D body "022-1_65.stp": height 0.02, standoff 0, extent -8.406,4.397 -6.756,4.617
3D body "022-1_65.stp": height 0.02, standoff 0, extent -8.406,3.897 -6.756,4.117
3D body "022-1_65.stp": height 0.02, standoff 0, extent -8.406,3.397 -6.756,3.617
3D body "022-1_65.stp": height 0.02, standoff 0, extent -8.406,2.897 -6.756,3.117
3D body "022-1_65.stp": height 0.02, standoff 0, extent -8.406,2.397 -6.756,2.617
3D body "022-1_65.stp": height 0.02, standoff 0, extent -8.406,1.897 -6.756,2.117
3D body "022-1_65.stp": height 0.02, standoff 0, extent -8.406,1.397 -6.756,1.617
3D body "022-1_65.stp": height 0.02, standoff 0, extent -8.406,0.897 -6.756,1.117
3D body "022-1_65.stp": height 0.02, standoff 0, extent -8.406,0.397 -6.756,0.617
3D body "022-1_65.stp": height 0.02, standoff 0, extent -8.406,-0.103 -6.756,0.117
3D body "022-1_65.stp": height 0.02, standoff 0, extent -8.406,-0.603 -6.756,-0.383
3D body "022-1_65.stp": height 0.02, standoff 0, extent -8.406,-1.103 -6.756,-0.883
3D body "022-1_65.stp": height 0.02, standoff 0, extent -8.406,-1.603 -6.756,-1.383
3D body "022-1_65.stp": height 0.02, standoff 0, extent -8.406,-2.103 -6.756,-1.883
3D body "022-1_65.stp": height 0.02, standoff 0, extent -8.406,-2.603 -6.756,-2.383
3D body "022-1_65.stp": height 0.02, standoff 0, extent -8.406,-3.103 -6.756,-2.883
3D body "022-1_65.stp": height 0.02, standoff 0, extent -8.406,-3.603 -6.756,-3.383
3D body "022-1_65.stp": height 0.02, standoff 0, extent -8.406,-4.103 -6.756,-3.883
3D body "022-1_65.stp": height 0.02, standoff 0, extent -8.406,-4.603 -6.756,-4.383
3D body "022-1_65.stp": height 0.02, standoff 0, extent -8.406,-5.103 -6.756,-4.883
3D body "022-1_65.stp": height 0.02, standoff 0, extent -8.406,-5.603 -6.756,-5.383
3D body "022-1_65.stp": height 0.02, standoff 0, extent -8.406,-6.103 -6.756,-5.883
3D body "022-1_65.stp": height 0.02, standoff 0, extent -6.117,-8.406 -5.897,-6.756
3D body "022-1_65.stp": height 0.02, standoff 0, extent -5.617,-8.406 -5.397,-6.756
3D body "022-1_65.stp": height 0.02, standoff 0, extent -5.117,-8.406 -4.897,-6.756
3D body "022-1_65.stp": height 0.02, standoff 0, extent -4.617,-8.406 -4.397,-6.756
3D body "022-1_65.stp": height 0.02, standoff 0, extent -4.117,-8.406 -3.897,-6.756
3D body "022-1_65.stp": height 0.02, standoff 0, extent -3.617,-8.406 -3.397,-6.756
3D body "022-1_65.stp": height 0.02, standoff 0, extent -3.117,-8.406 -2.897,-6.756
3D body "022-1_65.stp": height 0.02, standoff 0, extent -2.617,-8.406 -2.397,-6.756
3D body "022-1_65.stp": height 0.02, standoff 0, extent -2.117,-8.406 -1.897,-6.756
3D body "022-1_65.stp": height 0.02, standoff 0, extent -1.617,-8.406 -1.397,-6.756
3D body "022-1_65.stp": height 0.02, standoff 0, extent -1.117,-8.406 -0.897,-6.756
3D body "022-1_65.stp": height 0.02, standoff 0, extent -0.617,-8.406 -0.397,-6.756
3D body "022-1_65.stp": height 0.02, standoff 0, extent -0.117,-8.406 0.103,-6.756
3D body "022-1_65.stp": height 0.02, standoff 0, extent 0.383,-8.406 0.603,-6.756
3D body "022-1_65.stp": height 0.02, standoff 0, extent 0.883,-8.406 1.103,-6.756
3D body "022-1_65.stp": height 0.02, standoff 0, extent 1.383,-8.406 1.603,-6.756
3D body "022-1_65.stp": height 0.02, standoff 0, extent 1.883,-8.406 2.103,-6.756
3D body "022-1_65.stp": height 0.02, standoff 0, extent 2.383,-8.406 2.603,-6.756
3D body "022-1_65.stp": height 0.02, standoff 0, extent 2.883,-8.406 3.103,-6.756
3D body "022-1_65.stp": height 0.02, standoff 0, extent 3.383,-8.406 3.603,-6.756
3D body "022-1_65.stp": height 0.02, standoff 0, extent 3.883,-8.406 4.103,-6.756
3D body "022-1_65.stp": height 0.02, standoff 0, extent 4.383,-8.406 4.603,-6.756
3D body "022-1_65.stp": height 0.02, standoff 0, extent 4.883,-8.406 5.103,-6.756
3D body "022-1_65.stp": height 0.02, standoff 0, extent 5.383,-8.406 5.603,-6.756
3D body "022-1_65.stp": height 0.02, standoff 0, extent 5.883,-8.406 6.103,-6.756
3D body "022-1_65.stp": height 0.02, standoff 0, extent 6.756,-6.117 8.406,-5.897
3D body "022-1_65.stp": height 0.02, standoff 0, extent 6.756,-5.617 8.406,-5.397
3D body "022-1_65.stp": height 0.02, standoff 0, extent 6.756,-5.117 8.406,-4.897
3D body "022-1_65.stp": height 0.02, standoff 0, extent 6.756,-4.617 8.406,-4.397
3D body "022-1_65.stp": height 0.02, standoff 0, extent 6.756,-4.117 8.406,-3.897
3D body "022-1_65.stp": height 0.02, standoff 0, extent 6.756,-3.617 8.406,-3.397
3D body "022-1_65.stp": height 0.02, standoff 0, extent 6.756,-3.117 8.406,-2.897
3D body "022-1_65.stp": height 0.02, standoff 0, extent 6.756,-2.617 8.406,-2.397
3D body "022-1_65.stp": height 0.02, standoff 0, extent 6.756,-2.117 8.406,-1.897
3D body "022-1_65.stp": height 0.02, standoff 0, extent 6.756,-1.617 8.406,-1.397
3D body "022-1_65.stp": height 0.02, standoff 0, extent 6.756,-1.117 8.406,-0.897
3D body "022-1_65.stp": height 0.02, standoff 0, extent 6.756,-0.617 8.406,-0.397
3D body "022-1_65.stp": height 0.02, standoff 0, extent 6.756,-0.117 8.406,0.103
3D body "022-1_65.stp": height 0.02, standoff 0, extent 6.756,0.383 8.406,0.603
3D body "022-1_65.stp": height 0.02, standoff 0, extent 6.756,0.883 8.406,1.103
3D body "022-1_65.stp": height 0.02, standoff 0, extent 6.756,1.383 8.406,1.603
3D body "022-1_65.stp": height 0.02, standoff 0, extent 6.756,1.883 8.406,2.103
3D body "022-1_65.stp": height 0.02, standoff 0, extent 6.756,2.383 8.406,2.603
3D body "022-1_65.stp": height 0.02, standoff 0, extent 6.756,2.883 8.406,3.103
3D body "022-1_65.stp": height 0.02, standoff 0, extent 6.756,3.383 8.406,3.603
3D body "022-1_65.stp": height 0.02, standoff 0, extent 6.756,3.883 8.406,4.103
3D body "022-1_65.stp": height 0.02, standoff 0, extent 5.897,6.756 6.117,8.406
3D body "022-1_65.stp": height 0.02, standoff 0, extent 5.397,6.756 5.617,8.406
3D body "022-1_65.stp": height 0.02, standoff 0, extent 4.897,6.756 5.117,8.406
3D body "022-1_65.stp": height 0.02, standoff 0, extent 4.397,6.756 4.617,8.406
3D body "022-1_65.stp": height 0.02, standoff 0, extent 3.897,6.756 4.117,8.406
3D body "022-1_65.stp": height 0.02, standoff 0, extent 3.397,6.756 3.617,8.406
3D body "022-1_65.stp": height 0.02, standoff 0, extent 2.897,6.756 3.117,8.406
3D body "022-1_65.stp": height 0.02, standoff 0, extent 2.397,6.756 2.617,8.406
3D body "022-1_65.stp": height 0.02, standoff 0, extent 1.897,6.756 2.117,8.406
3D body "022-1_65.stp": height 0.02, standoff 0, extent 1.397,6.756 1.617,8.406
3D body "022-1_65.stp": height 0.02, standoff 0, extent 0.897,6.756 1.117,8.406
3D body "022-1_65.stp": height 0.02, standoff 0, extent 0.397,6.756 0.617,8.406
3D body "022-1_65.stp": height 0.02, standoff 0, extent -0.103,6.756 0.117,8.406
3D body "022-1_65.stp": height 0.02, standoff 0, extent -0.603,6.756 -0.383,8.406
3D body "022-1_65.stp": height 0.02, standoff 0, extent -1.103,6.756 -0.883,8.406
3D body "022-1_65.stp": height 0.02, standoff 0, extent -1.603,6.756 -1.383,8.406
3D body "022-1_65.stp": height 0.02, standoff 0, extent -2.103,6.756 -1.883,8.406
3D body "022-1_65.stp": height 0.02, standoff 0, extent -2.603,6.756 -2.383,8.406
3D body "022-1_65.stp": height 0.02, standoff 0, extent -3.103,6.756 -2.883,8.406
3D body "022-1_65.stp": height 0.02, standoff 0, extent -3.603,6.756 -3.383,8.406
3D body "022-1_65.stp": height 0.02, standoff 0, extent -4.103,6.756 -3.883,8.406
3D body "022-1_65.stp": height 0.02, standoff 0, extent -4.603,6.756 -4.383,8.406
3D body "022-1_65.stp": height 0.02, standoff 0, extent -5.103,6.756 -4.883,8.406
3D body "022-1_65.stp": height 0.02, standoff 0, extent -5.603,6.756 -5.383,8.406
3D body "022-1_65.stp": height 0.02, standoff 0, extent -6.103,6.756 -5.883,8.406